# Altium schematic symbol library jlcpcb_2025_04_capacitors_extended_0603.schlib: 3668 symbols (part 17 of 20)
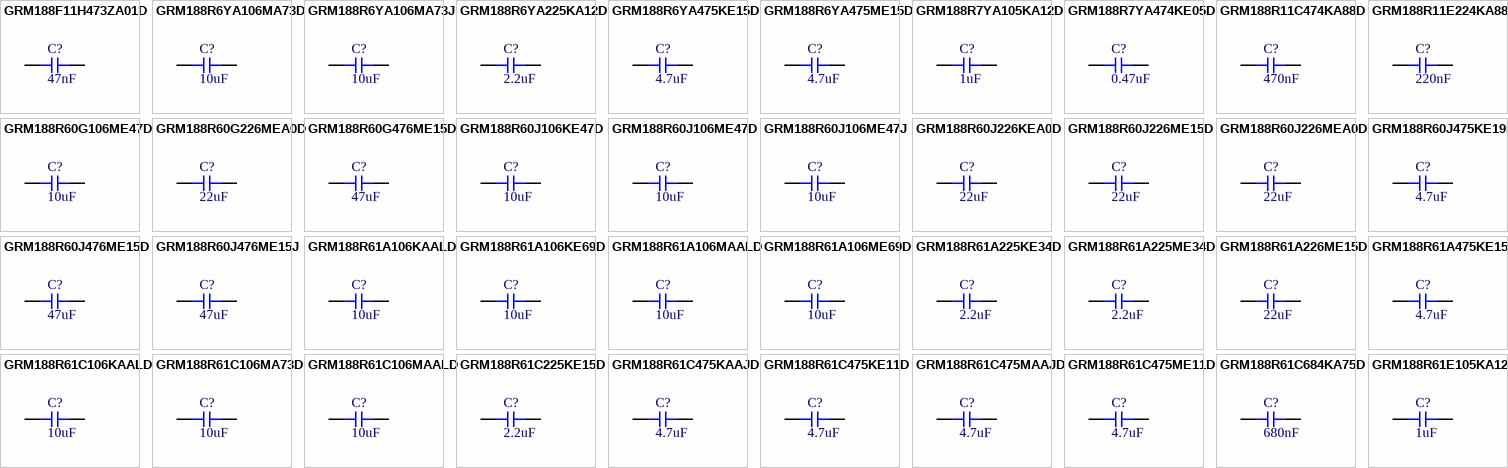
[diagram p107: symbols GRM188F11H473ZA01D to GRM188R61E105KA12D]

## GRM188R61E105KA12D
designator C?  Capacitance: 1uF  (hidden comment: *)
Capacitor, Ceramic (MLCC), 1uF, ±10%, 25V, X5R, ±10%, SMD 0603; Manufacturer: Murata Electronics; Manufacturer Part Number: GRM188R61E105KA12D; Package Size: 0603; JLCPCB Basic Part: No; JLCPCB Part Number: C77046; Supplier 1: LCSC; Category: Capacitors - MLCC; Supplier Part Number 1: C77046; Tolerance: ±10%; Voltage Rating: 25V; Temperature Coefficient: X5R; RoHS: Yes; ComponentLink1Description: Datasheet; ComponentLink1URL: https://wmsc.lcsc.com/wmsc/upload/file/pdf/v2/lcsc/2304140030_Murata-Electronics-GRM188R61E105KA12D_C77046.pdf; ComponentLink2Description: JLCPCB Part URL; ComponentLink2URL: https://jlcpcb.com/partdetail/C77046; ComponentLink3Description: LCSC Part URL; ComponentLink3URL: https://lcsc.com/product-detail/Multilayer-Ceramic-Capacitors-MLCC---SMD-SMT_Murata-Electronics-Murata-Electronics-GRM188R61E105KA12D_C77046.html
footprint CAP-0603 (0603 (1608M) Capacitor)
pins: 1, 2

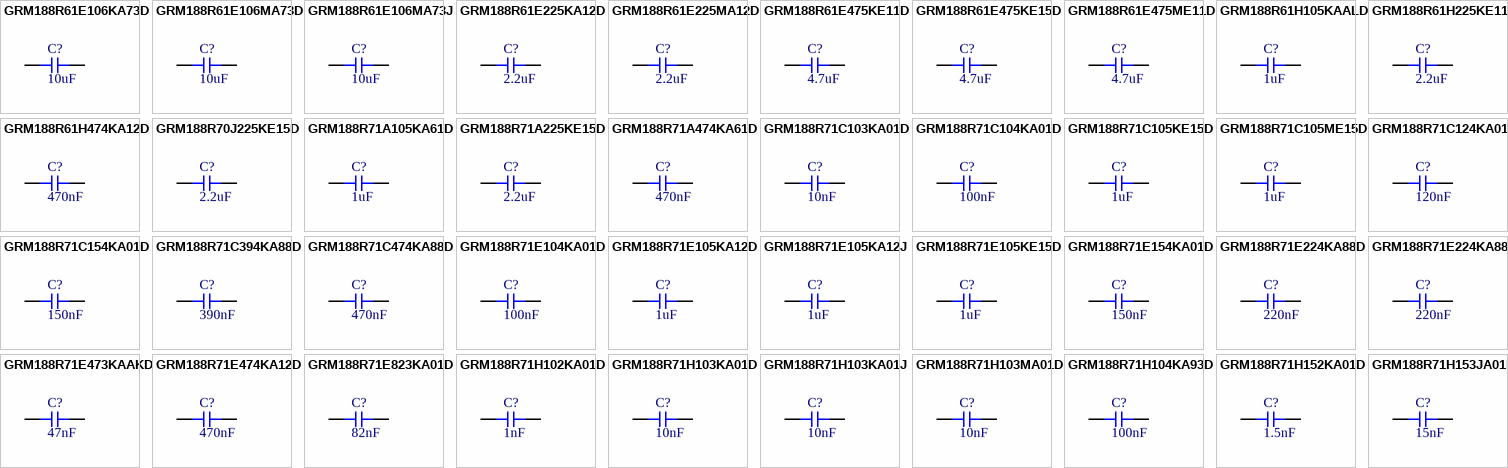
[diagram p74: symbols GRM188R61E106KA73D to GRM188R71H153JA01D]

## GRM188R61E106KA73D
designator C?  Capacitance: 10uF  (hidden comment: *)
Capacitor, Ceramic (MLCC), 10uF, ±10%, 25V, X5R, ±10%, SMD 0603; Manufacturer: Murata Electronics; Manufacturer Part Number: GRM188R61E106KA73D; Package Size: 0603; JLCPCB Basic Part: No; JLCPCB Part Number: C344022; Supplier 1: LCSC; Category: Capacitors - MLCC; Supplier Part Number 1: C344022; Tolerance: ±10%; Voltage Rating: 25V; Temperature Coefficient: X5R; RoHS: Yes; ComponentLink1Description: Datasheet; ComponentLink1URL: https://wmsc.lcsc.com/wmsc/upload/file/pdf/v2/lcsc/1912111437_Murata-Electronics-GRM188R61E106KA73D_C344022.pdf; ComponentLink2Description: JLCPCB Part URL; ComponentLink2URL: https://jlcpcb.com/partdetail/C344022; ComponentLink3Description: LCSC Part URL; ComponentLink3URL: https://lcsc.com/product-detail/Multilayer-Ceramic-Capacitors-MLCC---SMD-SMT_Murata-Electronics-Murata-Electronics-GRM188R61E106KA73D_C344022.html
footprint CAP-0603 (0603 (1608M) Capacitor)
pins: 1, 2

## GRM188R61E106MA73D
designator C?  Capacitance: 10uF  (hidden comment: *)
Capacitor, Ceramic (MLCC), 10uF, ±20%, 25V, X5R, ±20%, SMD 0603; Manufacturer: Murata Electronics; Manufacturer Part Number: GRM188R61E106MA73D; Package Size: 0603; JLCPCB Basic Part: No; JLCPCB Part Number: C91606; Supplier 1: LCSC; Category: Capacitors - MLCC; Supplier Part Number 1: C91606; Tolerance: ±20%; Voltage Rating: 25V; Temperature Coefficient: X5R; RoHS: Yes; ComponentLink1Description: Datasheet; ComponentLink1URL: https://wmsc.lcsc.com/wmsc/upload/file/pdf/v2/lcsc/1811131721_Murata-Electronics-GRM188R61E106MA73D_C91606.pdf; ComponentLink2Description: JLCPCB Part URL; ComponentLink2URL: https://jlcpcb.com/partdetail/C91606; ComponentLink3Description: LCSC Part URL; ComponentLink3URL: https://lcsc.com/product-detail/Multilayer-Ceramic-Capacitors-MLCC---SMD-SMT_Murata-Electronics-Murata-Electronics-GRM188R61E106MA73D_C91606.html
footprint CAP-0603 (0603 (1608M) Capacitor)
pins: 1, 2

## GRM188R61E106MA73J
designator C?  Capacitance: 10uF  (hidden comment: *)
Capacitor, Ceramic (MLCC), 10uF, ±20%, 25V, X5R, ±20%, SMD 0603; Manufacturer: Murata Electronics; Manufacturer Part Number: GRM188R61E106MA73J; Package Size: 0603; JLCPCB Basic Part: No; JLCPCB Part Number: C3833060; Supplier 1: LCSC; Category: Capacitors - MLCC; Supplier Part Number 1: C3833060; Tolerance: ±20%; Voltage Rating: 25V; Temperature Coefficient: X5R; RoHS: Yes; ComponentLink1Description: Datasheet; ComponentLink1URL: https://wmsc.lcsc.com/wmsc/upload/file/pdf/v2/lcsc/2308111511_Murata-Electronics-GRM188R61E106MA73J_C3833060.pdf; ComponentLink2Description: JLCPCB Part URL; ComponentLink2URL: https://jlcpcb.com/partdetail/C3833060; ComponentLink3Description: LCSC Part URL; ComponentLink3URL: https://lcsc.com/product-detail/Multilayer-Ceramic-Capacitors-MLCC---SMD-SMT_Murata-Electronics-Murata-Electronics-GRM188R61E106MA73J_C3833060.html
footprint CAP-0603 (0603 (1608M) Capacitor)
pins: 1, 2

## GRM188R61E225KA12D
designator C?  Capacitance: 2.2uF  (hidden comment: *)
Capacitor, Ceramic (MLCC), 2.2uF, ±10%, 25V, X5R, ±10%, SMD 0603; Manufacturer: Murata Electronics; Manufacturer Part Number: GRM188R61E225KA12D; Package Size: 0603; JLCPCB Basic Part: No; JLCPCB Part Number: C77047; Supplier 1: LCSC; Category: Capacitors - MLCC; Supplier Part Number 1: C77047; Tolerance: ±10%; Voltage Rating: 25V; Temperature Coefficient: X5R; RoHS: Yes; ComponentLink1Description: Datasheet; ComponentLink1URL: https://wmsc.lcsc.com/wmsc/upload/file/pdf/v2/lcsc/2304140030_Murata-Electronics-GRM188R61E225KA12D_C77047.pdf; ComponentLink2Description: JLCPCB Part URL; ComponentLink2URL: https://jlcpcb.com/partdetail/C77047; ComponentLink3Description: LCSC Part URL; ComponentLink3URL: https://lcsc.com/product-detail/Multilayer-Ceramic-Capacitors-MLCC---SMD-SMT_Murata-Electronics-Murata-Electronics-GRM188R61E225KA12D_C77047.html
footprint CAP-0603 (0603 (1608M) Capacitor)
pins: 1, 2

## GRM188R61E225MA12D
designator C?  Capacitance: 2.2uF  (hidden comment: *)
Capacitor, Ceramic (MLCC), 2.2uF, ±20%, 25V, X5R, ±20%, SMD 0603; Manufacturer: Murata Electronics; Manufacturer Part Number: GRM188R61E225MA12D; Package Size: 0603; JLCPCB Basic Part: No; JLCPCB Part Number: C668356; Supplier 1: LCSC; Category: Capacitors - MLCC; Supplier Part Number 1: C668356; Tolerance: ±20%; Voltage Rating: 25V; Temperature Coefficient: X5R; RoHS: Yes; ComponentLink1Description: Datasheet; ComponentLink1URL: https://wmsc.lcsc.com/wmsc/upload/file/pdf/v2/lcsc/2303141000_Murata-Electronics-GRM188R61E225MA12D_C668356.pdf; ComponentLink2Description: JLCPCB Part URL; ComponentLink2URL: https://jlcpcb.com/partdetail/C668356; ComponentLink3Description: LCSC Part URL; ComponentLink3URL: https://lcsc.com/product-detail/Multilayer-Ceramic-Capacitors-MLCC---SMD-SMT_Murata-Electronics-Murata-Electronics-GRM188R61E225MA12D_C668356.html
footprint CAP-0603 (0603 (1608M) Capacitor)
pins: 1, 2

## GRM188R61E475KE11D
designator C?  Capacitance: 4.7uF  (hidden comment: *)
Capacitor, Ceramic (MLCC), 4.7uF, ±10%, 25V, X5R, ±10%, SMD 0603; Manufacturer: Murata Electronics; Manufacturer Part Number: GRM188R61E475KE11D; Package Size: 0603; JLCPCB Basic Part: No; JLCPCB Part Number: C90057; Supplier 1: LCSC; Category: Capacitors - MLCC; Supplier Part Number 1: C90057; Tolerance: ±10%; Voltage Rating: 25V; Temperature Coefficient: X5R; RoHS: Yes; ComponentLink1Description: Datasheet; ComponentLink1URL: https://wmsc.lcsc.com/wmsc/upload/file/pdf/v2/lcsc/2304140030_Murata-Electronics-GRM188R61E475KE11D_C90057.pdf; ComponentLink2Description: JLCPCB Part URL; ComponentLink2URL: https://jlcpcb.com/partdetail/C90057; ComponentLink3Description: LCSC Part URL; ComponentLink3URL: https://lcsc.com/product-detail/Multilayer-Ceramic-Capacitors-MLCC---SMD-SMT_Murata-Electronics-Murata-Electronics-GRM188R61E475KE11D_C90057.html
footprint CAP-0603 (0603 (1608M) Capacitor)
pins: 1, 2

## GRM188R61E475KE15D
designator C?  Capacitance: 4.7uF  (hidden comment: *)
Capacitor, Ceramic (MLCC), 4.7uF, ±10%, 25V, X5R, ±10%, SMD 0603; Manufacturer: Murata Electronics; Manufacturer Part Number: GRM188R61E475KE15D; Package Size: 0603; JLCPCB Basic Part: No; JLCPCB Part Number: C408137; Supplier 1: LCSC; Category: Capacitors - MLCC; Supplier Part Number 1: C408137; Tolerance: ±10%; Voltage Rating: 25V; Temperature Coefficient: X5R; RoHS: Yes; ComponentLink1Description: Datasheet; ComponentLink1URL: https://wmsc.lcsc.com/wmsc/upload/file/pdf/v2/lcsc/2304140030_Murata-Electronics-GRM188R61E475KE15D_C408137.pdf; ComponentLink2Description: JLCPCB Part URL; ComponentLink2URL: https://jlcpcb.com/partdetail/C408137; ComponentLink3Description: LCSC Part URL; ComponentLink3URL: https://lcsc.com/product-detail/Multilayer-Ceramic-Capacitors-MLCC---SMD-SMT_Murata-Electronics-Murata-Electronics-GRM188R61E475KE15D_C408137.html
footprint CAP-0603 (0603 (1608M) Capacitor)
pins: 1, 2

## GRM188R61E475ME11D
designator C?  Capacitance: 4.7uF  (hidden comment: *)
Capacitor, Ceramic (MLCC), 4.7uF, ±20%, 25V, X5R, ±20%, SMD 0603; Manufacturer: Murata Electronics; Manufacturer Part Number: GRM188R61E475ME11D; Package Size: 0603; JLCPCB Basic Part: No; JLCPCB Part Number: C703136; Supplier 1: LCSC; Category: Capacitors - MLCC; Supplier Part Number 1: C703136; Tolerance: ±20%; Voltage Rating: 25V; Temperature Coefficient: X5R; RoHS: Yes; ComponentLink1Description: Datasheet; ComponentLink1URL: https://wmsc.lcsc.com/wmsc/upload/file/pdf/v2/lcsc/2201131100_Murata-Electronics-GRM188R61E475ME11D_C703136.pdf; ComponentLink2Description: JLCPCB Part URL; ComponentLink2URL: https://jlcpcb.com/partdetail/C703136; ComponentLink3Description: LCSC Part URL; ComponentLink3URL: https://lcsc.com/product-detail/Multilayer-Ceramic-Capacitors-MLCC---SMD-SMT_Murata-Electronics-Murata-Electronics-GRM188R61E475ME11D_C703136.html
footprint CAP-0603 (0603 (1608M) Capacitor)
pins: 1, 2

## GRM188R61H105KAALD
designator C?  Capacitance: 1uF  (hidden comment: *)
Capacitor, Ceramic (MLCC), 1uF, ±10%, 50V, X5R, ±10%, SMD 0603; Manufacturer: Murata Electronics; Manufacturer Part Number: GRM188R61H105KAALD; Package Size: 0603; JLCPCB Basic Part: No; JLCPCB Part Number: C77386; Supplier 1: LCSC; Category: Capacitors - MLCC; Supplier Part Number 1: C77386; Tolerance: ±10%; Voltage Rating: 50V; Temperature Coefficient: X5R; RoHS: Yes; ComponentLink1Description: Datasheet; ComponentLink1URL: https://wmsc.lcsc.com/wmsc/upload/file/pdf/v2/lcsc/1811012005_Murata-Electronics-GRM188R61H105KAALD_C77386.pdf; ComponentLink2Description: JLCPCB Part URL; ComponentLink2URL: https://jlcpcb.com/partdetail/C77386; ComponentLink3Description: LCSC Part URL; ComponentLink3URL: https://lcsc.com/product-detail/Multilayer-Ceramic-Capacitors-MLCC---SMD-SMT_Murata-Electronics-Murata-Electronics-GRM188R61H105KAALD_C77386.html
footprint CAP-0603 (0603 (1608M) Capacitor)
pins: 1, 2

## GRM188R61H225KE11D
designator C?  Capacitance: 2.2uF  (hidden comment: *)
Capacitor, Ceramic (MLCC), 2.2uF, ±10%, 50V, X5R, ±10%, SMD 0603; Manufacturer: Murata Electronics; Manufacturer Part Number: GRM188R61H225KE11D; Package Size: 0603; JLCPCB Basic Part: No; JLCPCB Part Number: C162273; Supplier 1: LCSC; Category: Capacitors - MLCC; Supplier Part Number 1: C162273; Tolerance: ±10%; Voltage Rating: 50V; Temperature Coefficient: X5R; RoHS: Yes; ComponentLink1Description: Datasheet; ComponentLink1URL: https://wmsc.lcsc.com/wmsc/upload/file/pdf/v2/lcsc/1912111437_Murata-Electronics-GRM188R61H225KE11D_C162273.pdf; ComponentLink2Description: JLCPCB Part URL; ComponentLink2URL: https://jlcpcb.com/partdetail/C162273; ComponentLink3Description: LCSC Part URL; ComponentLink3URL: https://lcsc.com/product-detail/Multilayer-Ceramic-Capacitors-MLCC---SMD-SMT_Murata-Electronics-Murata-Electronics-GRM188R61H225KE11D_C162273.html
footprint CAP-0603 (0603 (1608M) Capacitor)
pins: 1, 2

## GRM188R61H474KA12D
designator C?  Capacitance: 470nF  (hidden comment: *)
Capacitor, Ceramic (MLCC), 470nF, ±10%, 50V, X5R, ±10%, SMD 0603; Manufacturer: Murata Electronics; Manufacturer Part Number: GRM188R61H474KA12D; Package Size: 0603; JLCPCB Basic Part: No; JLCPCB Part Number: C123674; Supplier 1: LCSC; Category: Capacitors - MLCC; Supplier Part Number 1: C123674; Tolerance: ±10%; Voltage Rating: 50V; Temperature Coefficient: X5R; RoHS: Yes; ComponentLink1Description: Datasheet; ComponentLink1URL: https://wmsc.lcsc.com/wmsc/upload/file/pdf/v2/lcsc/2304140030_Murata-Electronics-GRM188R61H474KA12D_C123674.pdf; ComponentLink2Description: JLCPCB Part URL; ComponentLink2URL: https://jlcpcb.com/partdetail/C123674; ComponentLink3Description: LCSC Part URL; ComponentLink3URL: https://lcsc.com/product-detail/Multilayer-Ceramic-Capacitors-MLCC---SMD-SMT_Murata-Electronics-Murata-Electronics-GRM188R61H474KA12D_C123674.html
footprint CAP-0603 (0603 (1608M) Capacitor)
pins: 1, 2

## GRM188R70J225KE15D
designator C?  Capacitance: 2.2uF  (hidden comment: *)
Capacitor, Ceramic (MLCC), 2.2uF, ±10%, 6.3V, X7R, ±10%, SMD 0603; Manufacturer: Murata Electronics; Manufacturer Part Number: GRM188R70J225KE15D; Package Size: 0603; JLCPCB Basic Part: No; JLCPCB Part Number: C363943; Supplier 1: LCSC; Category: Capacitors - MLCC; Supplier Part Number 1: C363943; Tolerance: ±10%; Voltage Rating: 6.3V; Temperature Coefficient: X7R; RoHS: Yes; ComponentLink1Description: Datasheet; ComponentLink1URL: https://wmsc.lcsc.com/wmsc/upload/file/pdf/v2/lcsc/1912111437_Murata-Electronics-GRM188R70J225KE15D_C363943.pdf; ComponentLink2Description: JLCPCB Part URL; ComponentLink2URL: https://jlcpcb.com/partdetail/C363943; ComponentLink3Description: LCSC Part URL; ComponentLink3URL: https://lcsc.com/product-detail/Multilayer-Ceramic-Capacitors-MLCC---SMD-SMT_Murata-Electronics-Murata-Electronics-GRM188R70J225KE15D_C363943.html
footprint CAP-0603 (0603 (1608M) Capacitor)
pins: 1, 2

## GRM188R71A105KA61D
designator C?  Capacitance: 1uF  (hidden comment: *)
Capacitor, Ceramic (MLCC), 1uF, ±10%, 10V, X7R, ±10%, SMD 0603; Manufacturer: Murata Electronics; Manufacturer Part Number: GRM188R71A105KA61D; Package Size: 0603; JLCPCB Basic Part: No; JLCPCB Part Number: C97888; Supplier 1: LCSC; Category: Capacitors - MLCC; Supplier Part Number 1: C97888; Tolerance: ±10%; Voltage Rating: 10V; Temperature Coefficient: X7R; RoHS: Yes; ComponentLink1Description: Datasheet; ComponentLink1URL: https://wmsc.lcsc.com/wmsc/upload/file/pdf/v2/lcsc/1810311111_Murata-Electronics-GRM188R71A105KA61D_C97888.pdf; ComponentLink2Description: JLCPCB Part URL; ComponentLink2URL: https://jlcpcb.com/partdetail/C97888; ComponentLink3Description: LCSC Part URL; ComponentLink3URL: https://lcsc.com/product-detail/Multilayer-Ceramic-Capacitors-MLCC---SMD-SMT_Murata-Electronics-Murata-Electronics-GRM188R71A105KA61D_C97888.html
footprint CAP-0603 (0603 (1608M) Capacitor)
pins: 1, 2

## GRM188R71A225KE15D
designator C?  Capacitance: 2.2uF  (hidden comment: *)
Capacitor, Ceramic (MLCC), 2.2uF, ±10%, 10V, X7R, ±10%, SMD 0603; Manufacturer: Murata Electronics; Manufacturer Part Number: GRM188R71A225KE15D; Package Size: 0603; JLCPCB Basic Part: No; JLCPCB Part Number: C86018; Supplier 1: LCSC; Category: Capacitors - MLCC; Supplier Part Number 1: C86018; Tolerance: ±10%; Voltage Rating: 10V; Temperature Coefficient: X7R; RoHS: Yes; ComponentLink1Description: Datasheet; ComponentLink1URL: https://wmsc.lcsc.com/wmsc/upload/file/pdf/v2/lcsc/2304140030_Murata-Electronics-GRM188R71A225KE15D_C86018.pdf; ComponentLink2Description: JLCPCB Part URL; ComponentLink2URL: https://jlcpcb.com/partdetail/C86018; ComponentLink3Description: LCSC Part URL; ComponentLink3URL: https://lcsc.com/product-detail/Multilayer-Ceramic-Capacitors-MLCC---SMD-SMT_Murata-Electronics-Murata-Electronics-GRM188R71A225KE15D_C86018.html
footprint CAP-0603 (0603 (1608M) Capacitor)
pins: 1, 2

## GRM188R71A474KA61D
designator C?  Capacitance: 470nF  (hidden comment: *)
Capacitor, Ceramic (MLCC), 470nF, ±10%, 10V, X7R, ±10%, SMD 0603; Manufacturer: Murata Electronics; Manufacturer Part Number: GRM188R71A474KA61D; Package Size: 0603; JLCPCB Basic Part: No; JLCPCB Part Number: C435402; Supplier 1: LCSC; Category: Capacitors - MLCC; Supplier Part Number 1: C435402; Tolerance: ±10%; Voltage Rating: 10V; Temperature Coefficient: X7R; RoHS: Yes; ComponentLink1Description: Datasheet; ComponentLink1URL: https://wmsc.lcsc.com/wmsc/upload/file/pdf/v2/lcsc/2304140030_Murata-Electronics-GRM188R71A474KA61D_C435402.pdf; ComponentLink2Description: JLCPCB Part URL; ComponentLink2URL: https://jlcpcb.com/partdetail/C435402; ComponentLink3Description: LCSC Part URL; ComponentLink3URL: https://lcsc.com/product-detail/Multilayer-Ceramic-Capacitors-MLCC---SMD-SMT_Murata-Electronics-Murata-Electronics-GRM188R71A474KA61D_C435402.html
footprint CAP-0603 (0603 (1608M) Capacitor)
pins: 1, 2

## GRM188R71C103KA01D
designator C?  Capacitance: 10nF  (hidden comment: *)
Capacitor, Ceramic (MLCC), 10nF, ±10%, 16V, X7R, ±10%, SMD 0603; Manufacturer: Murata Electronics; Manufacturer Part Number: GRM188R71C103KA01D; Package Size: 0603; JLCPCB Basic Part: No; JLCPCB Part Number: C190784; Supplier 1: LCSC; Category: Capacitors - MLCC; Supplier Part Number 1: C190784; Tolerance: ±10%; Voltage Rating: 16V; Temperature Coefficient: X7R; RoHS: Yes; ComponentLink1Description: Datasheet; ComponentLink1URL: https://wmsc.lcsc.com/wmsc/upload/file/pdf/v2/lcsc/1810311125_Murata-Electronics-GRM188R71C103KA01D_C190784.pdf; ComponentLink2Description: JLCPCB Part URL; ComponentLink2URL: https://jlcpcb.com/partdetail/C190784; ComponentLink3Description: LCSC Part URL; ComponentLink3URL: https://lcsc.com/product-detail/Multilayer-Ceramic-Capacitors-MLCC---SMD-SMT_Murata-Electronics-Murata-Electronics-GRM188R71C103KA01D_C190784.html
footprint CAP-0603 (0603 (1608M) Capacitor)
pins: 1, 2

## GRM188R71C104KA01D
designator C?  Capacitance: 100nF  (hidden comment: *)
Capacitor, Ceramic (MLCC), 100nF, ±10%, 16V, X7R, ±10%, SMD 0603; Manufacturer: Murata Electronics; Manufacturer Part Number: GRM188R71C104KA01D; Package Size: 0603; JLCPCB Basic Part: No; JLCPCB Part Number: C45000; Supplier 1: LCSC; Category: Capacitors - MLCC; Supplier Part Number 1: C45000; Tolerance: ±10%; Voltage Rating: 16V; Temperature Coefficient: X7R; RoHS: Yes; ComponentLink1Description: Datasheet; ComponentLink1URL: https://wmsc.lcsc.com/wmsc/upload/file/pdf/v2/lcsc/1810311119_Murata-Electronics-GRM188R71C104KA01D_C45000.pdf; ComponentLink2Description: JLCPCB Part URL; ComponentLink2URL: https://jlcpcb.com/partdetail/C45000; ComponentLink3Description: LCSC Part URL; ComponentLink3URL: https://lcsc.com/product-detail/Multilayer-Ceramic-Capacitors-MLCC---SMD-SMT_Murata-Electronics-Murata-Electronics-GRM188R71C104KA01D_C45000.html
footprint CAP-0603 (0603 (1608M) Capacitor)
pins: 1, 2

## GRM188R71C105KE15D
designator C?  Capacitance: 1uF  (hidden comment: *)
Capacitor, Ceramic (MLCC), 1uF, ±10%, 16V, X7R, ±10%, SMD 0603; Manufacturer: Murata Electronics; Manufacturer Part Number: GRM188R71C105KE15D; Package Size: 0603; JLCPCB Basic Part: No; JLCPCB Part Number: C77049; Supplier 1: LCSC; Category: Capacitors - MLCC; Supplier Part Number 1: C77049; Tolerance: ±10%; Voltage Rating: 16V; Temperature Coefficient: X7R; RoHS: Yes; ComponentLink1Description: Datasheet; ComponentLink1URL: https://wmsc.lcsc.com/wmsc/upload/file/pdf/v2/lcsc/2304140030_Murata-Electronics-GRM188R71C105KE15D_C77049.pdf; ComponentLink2Description: JLCPCB Part URL; ComponentLink2URL: https://jlcpcb.com/partdetail/C77049; ComponentLink3Description: LCSC Part URL; ComponentLink3URL: https://lcsc.com/product-detail/Multilayer-Ceramic-Capacitors-MLCC---SMD-SMT_Murata-Electronics-Murata-Electronics-GRM188R71C105KE15D_C77049.html
footprint CAP-0603 (0603 (1608M) Capacitor)
pins: 1, 2

## GRM188R71C105ME15D
designator C?  Capacitance: 1uF  (hidden comment: *)
Capacitor, Ceramic (MLCC), 1uF, ±20%, 16V, X7R, ±20%, SMD 0603; Manufacturer: Murata Electronics; Manufacturer Part Number: GRM188R71C105ME15D; Package Size: 0603; JLCPCB Basic Part: No; JLCPCB Part Number: C723883; Supplier 1: LCSC; Category: Capacitors - MLCC; Supplier Part Number 1: C723883; Tolerance: ±20%; Voltage Rating: 16V; Temperature Coefficient: X7R; RoHS: Yes; ComponentLink1Description: Datasheet; ComponentLink1URL: https://wmsc.lcsc.com/wmsc/upload/file/pdf/v2/lcsc/2008241234_Murata-Electronics-GRM188R71C105ME15D_C723883.pdf; ComponentLink2Description: JLCPCB Part URL; ComponentLink2URL: https://jlcpcb.com/partdetail/C723883; ComponentLink3Description: LCSC Part URL; ComponentLink3URL: https://lcsc.com/product-detail/Multilayer-Ceramic-Capacitors-MLCC---SMD-SMT_Murata-Electronics-Murata-Electronics-GRM188R71C105ME15D_C723883.html
footprint CAP-0603 (0603 (1608M) Capacitor)
pins: 1, 2

## GRM188R71C124KA01D
designator C?  Capacitance: 120nF  (hidden comment: *)
Capacitor, Ceramic (MLCC), 120nF, ±10%, 16V, X7R, ±10%, SMD 0603; Manufacturer: Murata Electronics; Manufacturer Part Number: GRM188R71C124KA01D; Package Size: 0603; JLCPCB Basic Part: No; JLCPCB Part Number: C3868586; Supplier 1: LCSC; Category: Capacitors - MLCC; Supplier Part Number 1: C3868586; Tolerance: ±10%; Voltage Rating: 16V; Temperature Coefficient: X7R; RoHS: Yes; ComponentLink1Description: Datasheet; ComponentLink1URL: https://wmsc.lcsc.com/wmsc/upload/file/pdf/v2/lcsc/2308111511_Murata-Electronics-GRM188R71C124KA01D_C3868586.pdf; ComponentLink2Description: JLCPCB Part URL; ComponentLink2URL: https://jlcpcb.com/partdetail/C3868586; ComponentLink3Description: LCSC Part URL; ComponentLink3URL: https://lcsc.com/product-detail/Multilayer-Ceramic-Capacitors-MLCC---SMD-SMT_Murata-Electronics-Murata-Electronics-GRM188R71C124KA01D_C3868586.html
footprint CAP-0603 (0603 (1608M) Capacitor)
pins: 1, 2

## GRM188R71C154KA01D
designator C?  Capacitance: 150nF  (hidden comment: *)
Capacitor, Ceramic (MLCC), 150nF, ±10%, 16V, X7R, ±10%, SMD 0603; Manufacturer: Murata Electronics; Manufacturer Part Number: GRM188R71C154KA01D; Package Size: 0603; JLCPCB Basic Part: No; JLCPCB Part Number: C576477; Supplier 1: LCSC; Category: Capacitors - MLCC; Supplier Part Number 1: C576477; Tolerance: ±10%; Voltage Rating: 16V; Temperature Coefficient: X7R; RoHS: Yes; ComponentLink1Description: Datasheet; ComponentLink1URL: https://wmsc.lcsc.com/wmsc/upload/file/pdf/v2/lcsc/2204251545_Murata-Electronics-GRM188R71C154KA01D_C576477.pdf; ComponentLink2Description: JLCPCB Part URL; ComponentLink2URL: https://jlcpcb.com/partdetail/C576477; ComponentLink3Description: LCSC Part URL; ComponentLink3URL: https://lcsc.com/product-detail/Multilayer-Ceramic-Capacitors-MLCC---SMD-SMT_Murata-Electronics-Murata-Electronics-GRM188R71C154KA01D_C576477.html
footprint CAP-0603 (0603 (1608M) Capacitor)
pins: 1, 2

## GRM188R71C394KA88D
designator C?  Capacitance: 390nF  (hidden comment: *)
Capacitor, Ceramic (MLCC), 390nF, ±10%, 16V, X7R, ±10%, SMD 0603; Manufacturer: Murata Electronics; Manufacturer Part Number: GRM188R71C394KA88D; Package Size: 0603; JLCPCB Basic Part: No; JLCPCB Part Number: C437539; Supplier 1: LCSC; Category: Capacitors - MLCC; Supplier Part Number 1: C437539; Tolerance: ±10%; Voltage Rating: 16V; Temperature Coefficient: X7R; RoHS: Yes; ComponentLink1Description: Datasheet; ComponentLink1URL: https://wmsc.lcsc.com/wmsc/upload/file/pdf/v2/lcsc/2304140030_Murata-Electronics-GRM188R71C394KA88D_C437539.pdf; ComponentLink2Description: JLCPCB Part URL; ComponentLink2URL: https://jlcpcb.com/partdetail/C437539; ComponentLink3Description: LCSC Part URL; ComponentLink3URL: https://lcsc.com/product-detail/Multilayer-Ceramic-Capacitors-MLCC---SMD-SMT_Murata-Electronics-Murata-Electronics-GRM188R71C394KA88D_C437539.html
footprint CAP-0603 (0603 (1608M) Capacitor)
pins: 1, 2

## GRM188R71C474KA88D
designator C?  Capacitance: 470nF  (hidden comment: *)
Capacitor, Ceramic (MLCC), 470nF, ±10%, 16V, X7R, ±10%, SMD 0603; Manufacturer: Murata Electronics; Manufacturer Part Number: GRM188R71C474KA88D; Package Size: 0603; JLCPCB Basic Part: No; JLCPCB Part Number: C86019; Supplier 1: LCSC; Category: Capacitors - MLCC; Supplier Part Number 1: C86019; Tolerance: ±10%; Voltage Rating: 16V; Temperature Coefficient: X7R; RoHS: Yes; ComponentLink1Description: Datasheet; ComponentLink1URL: https://wmsc.lcsc.com/wmsc/upload/file/pdf/v2/lcsc/2304140030_Murata-Electronics-GRM188R71C474KA88D_C86019.pdf; ComponentLink2Description: JLCPCB Part URL; ComponentLink2URL: https://jlcpcb.com/partdetail/C86019; ComponentLink3Description: LCSC Part URL; ComponentLink3URL: https://lcsc.com/product-detail/Multilayer-Ceramic-Capacitors-MLCC---SMD-SMT_Murata-Electronics-Murata-Electronics-GRM188R71C474KA88D_C86019.html
footprint CAP-0603 (0603 (1608M) Capacitor)
pins: 1, 2

## GRM188R71E104KA01D
designator C?  Capacitance: 100nF  (hidden comment: *)
Capacitor, Ceramic (MLCC), 100nF, ±10%, 25V, X7R, ±10%, SMD 0603; Manufacturer: Murata Electronics; Manufacturer Part Number: GRM188R71E104KA01D; Package Size: 0603; JLCPCB Basic Part: No; JLCPCB Part Number: C77050; Supplier 1: LCSC; Category: Capacitors - MLCC; Supplier Part Number 1: C77050; Tolerance: ±10%; Voltage Rating: 25V; Temperature Coefficient: X7R; RoHS: Yes; ComponentLink1Description: Datasheet; ComponentLink1URL: https://wmsc.lcsc.com/wmsc/upload/file/pdf/v2/lcsc/1811021512_Murata-Electronics-GRM188R71E104KA01D_C77050.pdf; ComponentLink2Description: JLCPCB Part URL; ComponentLink2URL: https://jlcpcb.com/partdetail/C77050; ComponentLink3Description: LCSC Part URL; ComponentLink3URL: https://lcsc.com/product-detail/Multilayer-Ceramic-Capacitors-MLCC---SMD-SMT_Murata-Electronics-Murata-Electronics-GRM188R71E104KA01D_C77050.html
footprint CAP-0603 (0603 (1608M) Capacitor)
pins: 1, 2

## GRM188R71E105KA12D
designator C?  Capacitance: 1uF  (hidden comment: *)
Capacitor, Ceramic (MLCC), 1uF, ±10%, 25V, X7R, ±10%, SMD 0603; Manufacturer: Murata Electronics; Manufacturer Part Number: GRM188R71E105KA12D; Package Size: 0603; JLCPCB Basic Part: No; JLCPCB Part Number: C86020; Supplier 1: LCSC; Category: Capacitors - MLCC; Supplier Part Number 1: C86020; Tolerance: ±10%; Voltage Rating: 25V; Temperature Coefficient: X7R; RoHS: Yes; ComponentLink1Description: Datasheet; ComponentLink1URL: https://wmsc.lcsc.com/wmsc/upload/file/pdf/v2/lcsc/2304140030_Murata-Electronics-GRM188R71E105KA12D_C86020.pdf; ComponentLink2Description: JLCPCB Part URL; ComponentLink2URL: https://jlcpcb.com/partdetail/C86020; ComponentLink3Description: LCSC Part URL; ComponentLink3URL: https://lcsc.com/product-detail/Multilayer-Ceramic-Capacitors-MLCC---SMD-SMT_Murata-Electronics-Murata-Electronics-GRM188R71E105KA12D_C86020.html
footprint CAP-0603 (0603 (1608M) Capacitor)
pins: 1, 2

## GRM188R71E105KA12J
designator C?  Capacitance: 1uF  (hidden comment: *)
Capacitor, Ceramic (MLCC), 1uF, ±10%, ±10%, SMD 0603; Manufacturer: Murata Electronics; Manufacturer Part Number: GRM188R71E105KA12J; Package Size: 0603; JLCPCB Basic Part: No; JLCPCB Part Number: C908011; Supplier 1: LCSC; Category: Capacitors - MLCC; Supplier Part Number 1: C908011; Tolerance: ±10%; RoHS: Yes; ComponentLink1Description: Datasheet; ComponentLink1URL: https://wmsc.lcsc.com/wmsc/upload/file/pdf/v2/lcsc/2201242100_Murata-Electronics-GRM188R71E105KA12J_C908011.pdf; ComponentLink2Description: JLCPCB Part URL; ComponentLink2URL: https://jlcpcb.com/partdetail/C908011; ComponentLink3Description: LCSC Part URL; ComponentLink3URL: https://lcsc.com/product-detail/Multilayer-Ceramic-Capacitors-MLCC---SMD-SMT_Murata-Electronics-Murata-Electronics-GRM188R71E105KA12J_C908011.html
footprint CAP-0603 (0603 (1608M) Capacitor)
pins: 1, 2

## GRM188R71E105KE15D
designator C?  Capacitance: 1uF  (hidden comment: *)
Capacitor, Ceramic (MLCC), 1uF, ±10%, 25V, X7R, ±10%, SMD 0603; Manufacturer: Murata Electronics; Manufacturer Part Number: GRM188R71E105KE15D; Package Size: 0603; JLCPCB Basic Part: No; JLCPCB Part Number: C469535; Supplier 1: LCSC; Category: Capacitors - MLCC; Supplier Part Number 1: C469535; Tolerance: ±10%; Voltage Rating: 25V; Temperature Coefficient: X7R; RoHS: Yes; ComponentLink1Description: Datasheet; ComponentLink1URL: https://wmsc.lcsc.com/wmsc/upload/file/pdf/v2/lcsc/2304140030_Murata-Electronics-GRM188R71E105KE15D_C469535.pdf; ComponentLink2Description: JLCPCB Part URL; ComponentLink2URL: https://jlcpcb.com/partdetail/C469535; ComponentLink3Description: LCSC Part URL; ComponentLink3URL: https://lcsc.com/product-detail/Multilayer-Ceramic-Capacitors-MLCC---SMD-SMT_Murata-Electronics-Murata-Electronics-GRM188R71E105KE15D_C469535.html
footprint CAP-0603 (0603 (1608M) Capacitor)
pins: 1, 2

## GRM188R71E154KA01D
designator C?  Capacitance: 150nF  (hidden comment: *)
Capacitor, Ceramic (MLCC), 150nF, ±10%, 25V, X7R, ±10%, SMD 0603; Manufacturer: Murata Electronics; Manufacturer Part Number: GRM188R71E154KA01D; Package Size: 0603; JLCPCB Basic Part: No; JLCPCB Part Number: C426083; Supplier 1: LCSC; Category: Capacitors - MLCC; Supplier Part Number 1: C426083; Tolerance: ±10%; Voltage Rating: 25V; Temperature Coefficient: X7R; RoHS: Yes; ComponentLink1Description: Datasheet; ComponentLink1URL: https://wmsc.lcsc.com/wmsc/upload/file/pdf/v2/lcsc/2304140030_Murata-Electronics-GRM188R71E154KA01D_C426083.pdf; ComponentLink2Description: JLCPCB Part URL; ComponentLink2URL: https://jlcpcb.com/partdetail/C426083; ComponentLink3Description: LCSC Part URL; ComponentLink3URL: https://lcsc.com/product-detail/Multilayer-Ceramic-Capacitors-MLCC---SMD-SMT_Murata-Electronics-Murata-Electronics-GRM188R71E154KA01D_C426083.html
footprint CAP-0603 (0603 (1608M) Capacitor)
pins: 1, 2

## GRM188R71E224KA88D
designator C?  Capacitance: 220nF  (hidden comment: *)
Capacitor, Ceramic (MLCC), 220nF, ±10%, 25V, X7R, ±10%, SMD 0603; Manufacturer: Murata Electronics; Manufacturer Part Number: GRM188R71E224KA88D; Package Size: 0603; JLCPCB Basic Part: No; JLCPCB Part Number: C77051; Supplier 1: LCSC; Category: Capacitors - MLCC; Supplier Part Number 1: C77051; Tolerance: ±10%; Voltage Rating: 25V; Temperature Coefficient: X7R; RoHS: Yes; ComponentLink1Description: Datasheet; ComponentLink1URL: https://wmsc.lcsc.com/wmsc/upload/file/pdf/v2/lcsc/2304140030_Murata-Electronics-GRM188R71E224KA88D_C77051.pdf; ComponentLink2Description: JLCPCB Part URL; ComponentLink2URL: https://jlcpcb.com/partdetail/C77051; ComponentLink3Description: LCSC Part URL; ComponentLink3URL: https://lcsc.com/product-detail/Multilayer-Ceramic-Capacitors-MLCC---SMD-SMT_Murata-Electronics-Murata-Electronics-GRM188R71E224KA88D_C77051.html
footprint CAP-0603 (0603 (1608M) Capacitor)
pins: 1, 2

## GRM188R71E224KA88J
designator C?  Capacitance: 220nF  (hidden comment: *)
Capacitor, Ceramic (MLCC), 220nF, ±10%, 25V, X7R, ±10%, SMD 0603; Manufacturer: Murata Electronics; Manufacturer Part Number: GRM188R71E224KA88J; Package Size: 0603; JLCPCB Basic Part: No; JLCPCB Part Number: C2176760; Supplier 1: LCSC; Category: Capacitors - MLCC; Supplier Part Number 1: C2176760; Tolerance: ±10%; Voltage Rating: 25V; Temperature Coefficient: X7R; RoHS: Yes; ComponentLink1Description: Datasheet; ComponentLink1URL: https://wmsc.lcsc.com/wmsc/upload/file/pdf/v2/lcsc/2308111639_Murata-Electronics-GRM188R71E224KA88J_C2176760.pdf; ComponentLink2Description: JLCPCB Part URL; ComponentLink2URL: https://jlcpcb.com/partdetail/C2176760; ComponentLink3Description: LCSC Part URL; ComponentLink3URL: https://lcsc.com/product-detail/Multilayer-Ceramic-Capacitors-MLCC---SMD-SMT_Murata-Electronics-Murata-Electronics-GRM188R71E224KA88J_C2176760.html
footprint CAP-0603 (0603 (1608M) Capacitor)
pins: 1, 2

## GRM188R71E473KAAKD
designator C?  Capacitance: 47nF  (hidden comment: *)
Capacitor, Ceramic (MLCC), 47nF, ±10%, 25V, X7R, ±10%, SMD 0603; Manufacturer: Murata Electronics; Manufacturer Part Number: GRM188R71E473KAAKD; Package Size: 0603; JLCPCB Basic Part: No; JLCPCB Part Number: C521232; Supplier 1: LCSC; Category: Capacitors - MLCC; Supplier Part Number 1: C521232; Tolerance: ±10%; Voltage Rating: 25V; Temperature Coefficient: X7R; RoHS: Yes; ComponentLink1Description: Datasheet; ComponentLink1URL: https://wmsc.lcsc.com/wmsc/upload/file/pdf/v2/lcsc/2304140030_Murata-Electronics-GRM188R71E473KAAKD_C521232.pdf; ComponentLink2Description: JLCPCB Part URL; ComponentLink2URL: https://jlcpcb.com/partdetail/C521232; ComponentLink3Description: LCSC Part URL; ComponentLink3URL: https://lcsc.com/product-detail/Multilayer-Ceramic-Capacitors-MLCC---SMD-SMT_Murata-Electronics-Murata-Electronics-GRM188R71E473KAAKD_C521232.html
footprint CAP-0603 (0603 (1608M) Capacitor)
pins: 1, 2

## GRM188R71E474KA12D
designator C?  Capacitance: 470nF  (hidden comment: *)
Capacitor, Ceramic (MLCC), 470nF, ±10%, 25V, X7R, ±10%, SMD 0603; Manufacturer: Murata Electronics; Manufacturer Part Number: GRM188R71E474KA12D; Package Size: 0603; JLCPCB Basic Part: No; JLCPCB Part Number: C77052; Supplier 1: LCSC; Category: Capacitors - MLCC; Supplier Part Number 1: C77052; Tolerance: ±10%; Voltage Rating: 25V; Temperature Coefficient: X7R; RoHS: Yes; ComponentLink1Description: Datasheet; ComponentLink1URL: https://wmsc.lcsc.com/wmsc/upload/file/pdf/v2/lcsc/2304140030_Murata-Electronics-GRM188R71E474KA12D_C77052.pdf; ComponentLink2Description: JLCPCB Part URL; ComponentLink2URL: https://jlcpcb.com/partdetail/C77052; ComponentLink3Description: LCSC Part URL; ComponentLink3URL: https://lcsc.com/product-detail/Multilayer-Ceramic-Capacitors-MLCC---SMD-SMT_Murata-Electronics-Murata-Electronics-GRM188R71E474KA12D_C77052.html
footprint CAP-0603 (0603 (1608M) Capacitor)
pins: 1, 2

## GRM188R71E823KA01D
designator C?  Capacitance: 82nF  (hidden comment: *)
Capacitor, Ceramic (MLCC), 82nF, ±10%, 25V, X7R, ±10%, SMD 0603; Manufacturer: Murata Electronics; Manufacturer Part Number: GRM188R71E823KA01D; Package Size: 0603; JLCPCB Basic Part: No; JLCPCB Part Number: C117944; Supplier 1: LCSC; Category: Capacitors - MLCC; Supplier Part Number 1: C117944; Tolerance: ±10%; Voltage Rating: 25V; Temperature Coefficient: X7R; RoHS: Yes; ComponentLink1Description: Datasheet; ComponentLink1URL: https://wmsc.lcsc.com/wmsc/upload/file/pdf/v2/lcsc/2304140030_Murata-Electronics-GRM188R71E823KA01D_C117944.pdf; ComponentLink2Description: JLCPCB Part URL; ComponentLink2URL: https://jlcpcb.com/partdetail/C117944; ComponentLink3Description: LCSC Part URL; ComponentLink3URL: https://lcsc.com/product-detail/Multilayer-Ceramic-Capacitors-MLCC---SMD-SMT_Murata-Electronics-Murata-Electronics-GRM188R71E823KA01D_C117944.html
footprint CAP-0603 (0603 (1608M) Capacitor)
pins: 1, 2

## GRM188R71H102KA01D
designator C?  Capacitance: 1nF  (hidden comment: *)
Capacitor, Ceramic (MLCC), 1nF, ±10%, 50V, X7R, ±10%, SMD 0603; Manufacturer: Murata Electronics; Manufacturer Part Number: GRM188R71H102KA01D; Package Size: 0603; JLCPCB Basic Part: No; JLCPCB Part Number: C71653; Supplier 1: LCSC; Category: Capacitors - MLCC; Supplier Part Number 1: C71653; Tolerance: ±10%; Voltage Rating: 50V; Temperature Coefficient: X7R; RoHS: Yes; ComponentLink1Description: Datasheet; ComponentLink1URL: https://wmsc.lcsc.com/wmsc/upload/file/pdf/v2/lcsc/1810311122_Murata-Electronics-GRM188R71H102KA01D_C71653.pdf; ComponentLink2Description: JLCPCB Part URL; ComponentLink2URL: https://jlcpcb.com/partdetail/C71653; ComponentLink3Description: LCSC Part URL; ComponentLink3URL: https://lcsc.com/product-detail/Multilayer-Ceramic-Capacitors-MLCC---SMD-SMT_Murata-Electronics-Murata-Electronics-GRM188R71H102KA01D_C71653.html
footprint CAP-0603 (0603 (1608M) Capacitor)
pins: 1, 2

## GRM188R71H103KA01D
designator C?  Capacitance: 10nF  (hidden comment: *)
Capacitor, Ceramic (MLCC), 10nF, ±10%, 50V, X7R, ±10%, SMD 0603; Manufacturer: Murata Electronics; Manufacturer Part Number: GRM188R71H103KA01D; Package Size: 0603; JLCPCB Basic Part: No; JLCPCB Part Number: C77053; Supplier 1: LCSC; Category: Capacitors - MLCC; Supplier Part Number 1: C77053; Tolerance: ±10%; Voltage Rating: 50V; Temperature Coefficient: X7R; RoHS: Yes; ComponentLink1Description: Datasheet; ComponentLink1URL: https://wmsc.lcsc.com/wmsc/upload/file/pdf/v2/lcsc/2304140030_Murata-Electronics-GRM188R71H103KA01D_C77053.pdf; ComponentLink2Description: JLCPCB Part URL; ComponentLink2URL: https://jlcpcb.com/partdetail/C77053; ComponentLink3Description: LCSC Part URL; ComponentLink3URL: https://lcsc.com/product-detail/Multilayer-Ceramic-Capacitors-MLCC---SMD-SMT_Murata-Electronics-Murata-Electronics-GRM188R71H103KA01D_C77053.html
footprint CAP-0603 (0603 (1608M) Capacitor)
pins: 1, 2

## GRM188R71H103KA01J
designator C?  Capacitance: 10nF  (hidden comment: *)
Capacitor, Ceramic (MLCC), 10nF, ±10%, 50V, X7R, ±10%, SMD 0603; Manufacturer: Murata Electronics; Manufacturer Part Number: GRM188R71H103KA01J; Package Size: 0603; JLCPCB Basic Part: No; JLCPCB Part Number: C470844; Supplier 1: LCSC; Category: Capacitors - MLCC; Supplier Part Number 1: C470844; Tolerance: ±10%; Voltage Rating: 50V; Temperature Coefficient: X7R; RoHS: Yes; ComponentLink1Description: Datasheet; ComponentLink1URL: https://wmsc.lcsc.com/wmsc/upload/file/pdf/v2/lcsc/2304140030_Murata-Electronics-GRM188R71H103KA01J_C470844.pdf; ComponentLink2Description: JLCPCB Part URL; ComponentLink2URL: https://jlcpcb.com/partdetail/C470844; ComponentLink3Description: LCSC Part URL; ComponentLink3URL: https://lcsc.com/product-detail/Multilayer-Ceramic-Capacitors-MLCC---SMD-SMT_Murata-Electronics-Murata-Electronics-GRM188R71H103KA01J_C470844.html
footprint CAP-0603 (0603 (1608M) Capacitor)
pins: 1, 2

## GRM188R71H103MA01D
designator C?  Capacitance: 10nF  (hidden comment: *)
Capacitor, Ceramic (MLCC), 10nF, ±20%, 50V, X7R, ±20%, SMD 0603; Manufacturer: Murata Electronics; Manufacturer Part Number: GRM188R71H103MA01D; Package Size: 0603; JLCPCB Basic Part: No; JLCPCB Part Number: C185599; Supplier 1: LCSC; Category: Capacitors - MLCC; Supplier Part Number 1: C185599; Tolerance: ±20%; Voltage Rating: 50V; Temperature Coefficient: X7R; RoHS: Yes; ComponentLink1Description: Datasheet; ComponentLink1URL: https://wmsc.lcsc.com/wmsc/upload/file/pdf/v2/lcsc/1810311136_Murata-Electronics-GRM188R71H103MA01D_C185599.pdf; ComponentLink2Description: JLCPCB Part URL; ComponentLink2URL: https://jlcpcb.com/partdetail/C185599; ComponentLink3Description: LCSC Part URL; ComponentLink3URL: https://lcsc.com/product-detail/Multilayer-Ceramic-Capacitors-MLCC---SMD-SMT_Murata-Electronics-Murata-Electronics-GRM188R71H103MA01D_C185599.html
footprint CAP-0603 (0603 (1608M) Capacitor)
pins: 1, 2

## GRM188R71H104KA93D
designator C?  Capacitance: 100nF  (hidden comment: *)
Capacitor, Ceramic (MLCC), 100nF, ±10%, 50V, X7R, ±10%, SMD 0603; Manufacturer: Murata Electronics; Manufacturer Part Number: GRM188R71H104KA93D; Package Size: 0603; JLCPCB Basic Part: No; JLCPCB Part Number: C77055; Supplier 1: LCSC; Category: Capacitors - MLCC; Supplier Part Number 1: C77055; Tolerance: ±10%; Voltage Rating: 50V; Temperature Coefficient: X7R; RoHS: Yes; ComponentLink1Description: Datasheet; ComponentLink1URL: https://wmsc.lcsc.com/wmsc/upload/file/pdf/v2/lcsc/2304140030_Murata-Electronics-GRM188R71H104KA93D_C77055.pdf; ComponentLink2Description: JLCPCB Part URL; ComponentLink2URL: https://jlcpcb.com/partdetail/C77055; ComponentLink3Description: LCSC Part URL; ComponentLink3URL: https://lcsc.com/product-detail/Multilayer-Ceramic-Capacitors-MLCC---SMD-SMT_Murata-Electronics-Murata-Electronics-GRM188R71H104KA93D_C77055.html
footprint CAP-0603 (0603 (1608M) Capacitor)
pins: 1, 2

## GRM188R71H152KA01D
designator C?  Capacitance: 1.5nF  (hidden comment: *)
Capacitor, Ceramic (MLCC), 1.5nF, ±10%, 50V, X7R, ±10%, SMD 0603; Manufacturer: Murata Electronics; Manufacturer Part Number: GRM188R71H152KA01D; Package Size: 0603; JLCPCB Basic Part: No; JLCPCB Part Number: C123673; Supplier 1: LCSC; Category: Capacitors - MLCC; Supplier Part Number 1: C123673; Tolerance: ±10%; Voltage Rating: 50V; Temperature Coefficient: X7R; RoHS: Yes; ComponentLink1Description: Datasheet; ComponentLink1URL: https://wmsc.lcsc.com/wmsc/upload/file/pdf/v2/lcsc/1810311135_Murata-Electronics-GRM188R71H152KA01D_C123673.pdf; ComponentLink2Description: JLCPCB Part URL; ComponentLink2URL: https://jlcpcb.com/partdetail/C123673; ComponentLink3Description: LCSC Part URL; ComponentLink3URL: https://lcsc.com/product-detail/Multilayer-Ceramic-Capacitors-MLCC---SMD-SMT_Murata-Electronics-Murata-Electronics-GRM188R71H152KA01D_C123673.html
footprint CAP-0603 (0603 (1608M) Capacitor)
pins: 1, 2

## GRM188R71H153JA01D
designator C?  Capacitance: 15nF  (hidden comment: *)
Capacitor, Ceramic (MLCC), 15nF, ±5%, 50V, X7R, ±5%, SMD 0603; Manufacturer: Murata Electronics; Manufacturer Part Number: GRM188R71H153JA01D; Package Size: 0603; JLCPCB Basic Part: No; JLCPCB Part Number: C464436; Supplier 1: LCSC; Category: Capacitors - MLCC; Supplier Part Number 1: C464436; Tolerance: ±5%; Voltage Rating: 50V; Temperature Coefficient: X7R; RoHS: Yes; ComponentLink1Description: Datasheet; ComponentLink1URL: https://wmsc.lcsc.com/wmsc/upload/file/pdf/v2/lcsc/2304140030_Murata-Electronics-GRM188R71H153JA01D_C464436.pdf; ComponentLink2Description: JLCPCB Part URL; ComponentLink2URL: https://jlcpcb.com/partdetail/C464436; ComponentLink3Description: LCSC Part URL; ComponentLink3URL: https://lcsc.com/product-detail/Multilayer-Ceramic-Capacitors-MLCC---SMD-SMT_Murata-Electronics-Murata-Electronics-GRM188R71H153JA01D_C464436.html
footprint CAP-0603 (0603 (1608M) Capacitor)
pins: 1, 2
